# Altium footprint library 集大电协1.5.PcbLib: 283 footprints (part 18 of 18)
Each footprint in its own frame and in the unit in brackets; x right, y up, seen from the top. Pads: shape width x height; smd on the part's side, far side on the other; paste and mask are expansions set on the pad; w line width, h text height; cw(c..) or ccw(c..) is an arc to the next point about the centre after c.
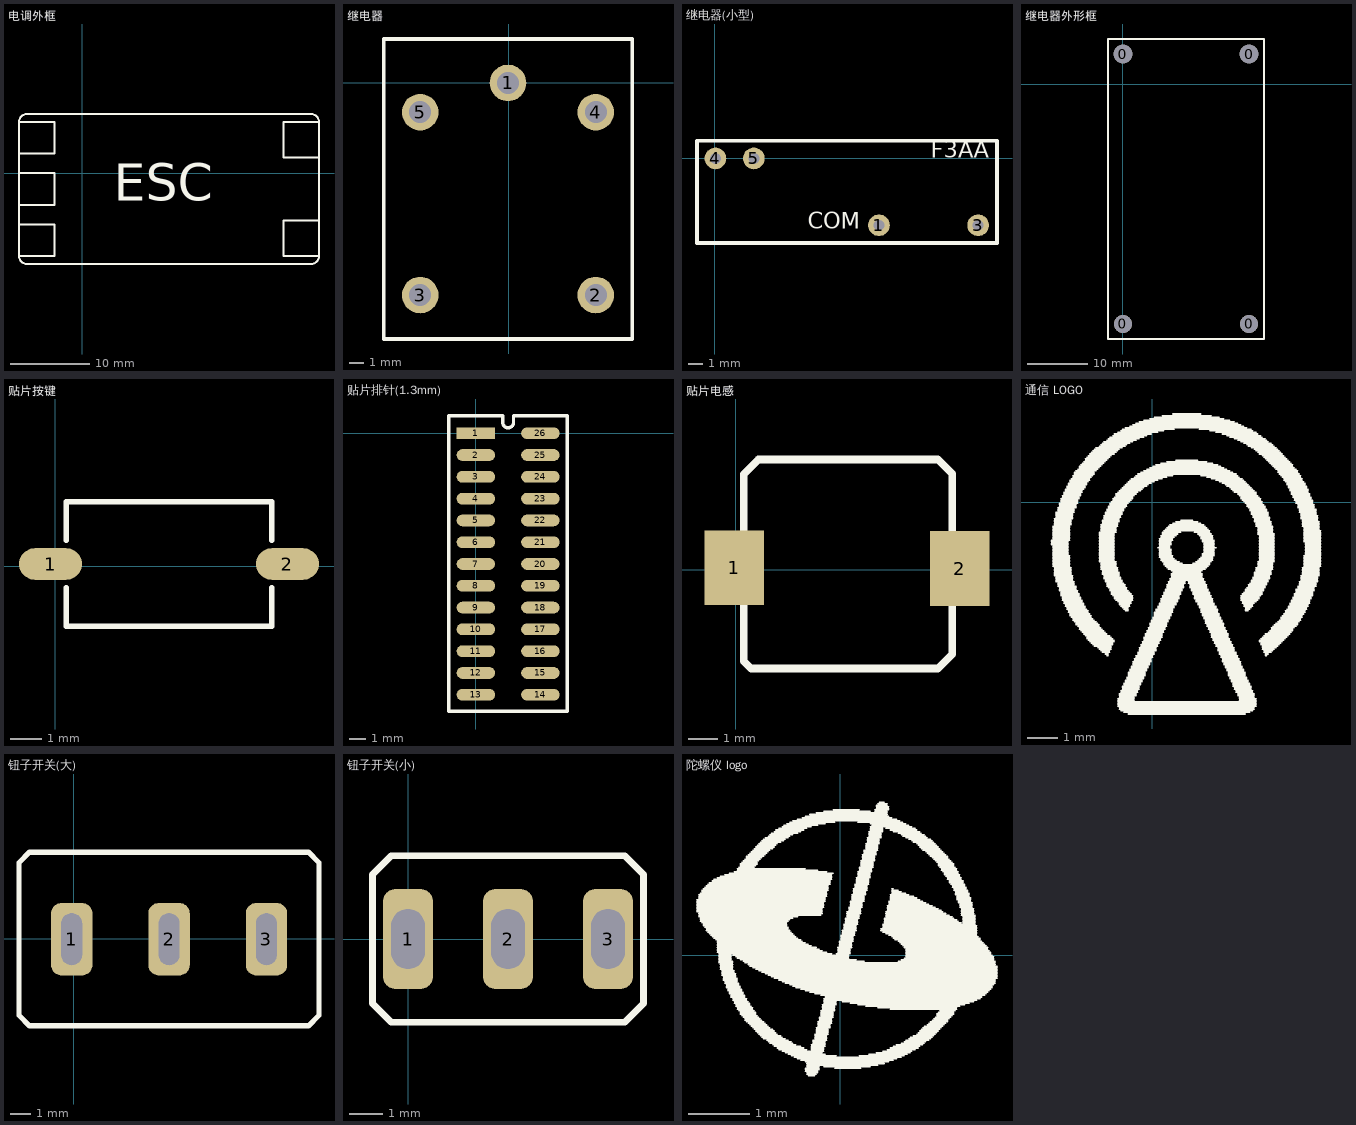
[diagram p17: the footprints below, top view; thin cyan lines are the x and y axes]

## 电调外框 [mm]
Top Overlay:
  lines w0.254: -8,-6.5 -3.5,-6.5 -3.5,-10.5 -8,-10.5 ; -8,-4 -3.5,-4 -3.5,0 -8,0 ; -8,2.5 -3.5,2.5 -3.5,6.5 -8,6.5 ; 30,-6 25.5,-6 25.5,-10.5 30,-10.5 ; 30,2 25.5,2 25.5,6.5 30,6.5 ; -8,-10.5 ccw(c-7,-10.5) -7,-11.5 29,-11.5 ccw(c29,-10.5) 30,-10.5 ; -8,-10.5 -8,6.5 ; -8,6.5 cw(c-7,6.5) -7,7.5 29,7.5 cw(c29,6.5) 30,6.5 ; 30,-10.5 30,6.5
  text "ESC" at 4,-5 h8

## 继电器 [mil]
pads (5):
  round 100 hole 60: 1(-2.19,-1.05) 2(237.81,-581.05) 3(-242.19,-581.05) 4(237.81,-81.05) 5(-242.19,-81.05)
Top Overlay:
  lines w10: -342.19,58.95 -342.19,118.95 337.81,118.95 ; -342.19,78.95 -342.19,-701.05 337.81,-701.05 337.81,78.95 337.81,118.95 ; -262.19,118.95 337.81,118.95
3D body "继电器.ST": height 587.01, standoff -98.43, extent -330.71,-732.28 334.65,133.86

## 继电器(小型) [mil] "F3AA (20mm*7mm)"
pads (4):
  round 60 hole 30: 1(454.72,-186.02) 3(729.33,-186.02) 4(1.97,-0.98) 5(108.27,-0.98)
Top Overlay:
  lines w10: -49.21,-235.24 -49.21,48.23 781.5,48.23 781.5,-235.24 -49.21,-235.24
  text "F3AA" at 597.44,-14.76 h78.74
  text "COM" at 257.87,-211.61 h78.74
Mechanical 1:
3D body: height 590.55, standoff 0, extent -50.2,-232.28 780.51,49.21

## 继电器外形框 [mm]
pads (4):
  round 3 hole 3: 0(0,-40) 0(21,-40)
  round 3.1 hole 3.1: 0(0,5) 0(21,5)
Top Overlay:
  lines w0.254: -2.5,-42.5 23.5,-42.5 23.5,7.5 7.5,7.5 -2.5,7.5 -2.5,-42.5
3D body: height 20, standoff 10, extent -2.5,-42.5 23.5,7.5
3D body: height 15, standoff 0, extent -1.542,3.452 1.55,6.548
3D body: height 15, standoff 0, extent 19.458,3.452 22.55,6.548
3D body: height 15, standoff 0, extent 19.458,-41.548 22.55,-38.452
3D body: height 15, standoff 0, extent -1.542,-41.548 1.55,-38.452
3D body: height 25, standoff 15, extent 4.5,-35 17.5,-17.5

## 贴片按键 [mil]
pads (2):
  oval 80x40 smd: 1(-5.71,2.8) 2(294.29,2.8)
Top Overlay:
  lines w7: 14.13,-27.2 14.13,-75.94 274.19,-75.94 274.45,-27.21 ; 14.13,32.8 14.13,81.54 274.29,81.54 274.29,32.8
3D body: height 47.24, standoff 31.5, extent 94.29,-27.2 194.29,32.8
3D body "TVBU19.STEP": height 98.43, standoff 0, extent 24.22,-69.03 264.38,76.64

## 贴片排针(1.3mm) [mm]
pads (26):
  rect 2.3x0.7 smd: 1(0,0)
  oval 2.3x0.7 smd: 2(0,-1.3) 3(0,-2.6) 4(0,-3.9) 5(0,-5.2) 6(0,-6.5) 7(0,-7.8) 8(0,-9.1) 9(0,-10.4) 10(0,-11.7) 11(0,-13) 12(0,-14.3) 13(0,-15.6) 14(3.85,-15.6) 15(3.85,-14.3) 16(3.85,-13) 17(3.85,-11.7) 18(3.85,-10.4) 19(3.85,-9.1) 20(3.85,-7.8) 21(3.85,-6.5) 22(3.85,-5.2) 23(3.85,-3.9) 24(3.85,-2.6) 25(3.85,-1.3) 26(3.85,0)
Top Overlay:
  lines w0.2: -1.626,-16.586 -1.626,1.041 1.6,1.041 1.6,0.65 ccw(c1.925,0.65) 2.25,0.65 2.25,1.041 5.461,1.041 5.461,-16.586 -1.626,-16.586

## 贴片电感 [mm]
pads (2):
  rect 2x2.5 smd: 1(-0.048,0.065) 2(7.496,0.04)
Top Overlay:
  lines w0.254: 0.262,-3.058 0.262,3.192 0.762,3.692 6.762,3.692 7.247,3.207 7.247,-2.823 6.762,-3.308 0.512,-3.308 0.262,-3.058
3D body "User Library-Inductor VLC6045 Series.STEP": height 4.5, standoff 0, extent 0.709,-2.873 6.709,3.127

## 通信 LOGO [mm]
Top Overlay:
  drawing of 720 lines, arcs and shapes, not listed

## 钮子开关(大) [mm]
pads (3):
  rrect50% 2x3.5 hole 1 slot 2.5 at 90 deg: 1(-0.102,-0.025) 2(4.598,-0.025) 3(9.298,-0.025)
Top Overlay:
  lines w0.254: 10.817,4.175 11.071,4.175 ; 11.071,4.175 11.325,4.175 11.833,3.667 11.833,-0.143 11.833,-3.699 11.325,-4.207 -2.137,-4.207 -2.645,-3.699 -2.645,3.667 -2.137,4.175 11.071,4.175
3D body: height 28.19, standoff -3.17, extent -1.85,-6.06 10.85,5.8

## 钮子开关(小) [mm]
pads (3):
  rrect50% 1.5x3 hole 1 slot 1.8 at 90 deg: 1(0,0) 2(3,0) 3(6,0)
Top Overlay:
  lines w0.2: -1.064,-1.936 -1.064,1.936 -0.5,2.5 6.5,2.5 7.064,1.936 7.064,-1.936 6.5,-2.5 3,-2.5 -0.5,-2.5 -1.064,-1.936

## 陀螺仪 logo [mm]
Top Overlay:
  drawing of 476 lines, arcs and shapes, not listed